# Altium footprint library RPIadaptor.PcbLib: 85 footprints (part 4 of 6)
Each footprint in its own frame and in the unit in brackets; x right, y up, seen from the top. Pads: shape width x height; smd on the part's side, far side on the other; paste and mask are expansions set on the pad; w line width, h text height; cw(c..) or ccw(c..) is an arc to the next point about the centre after c.
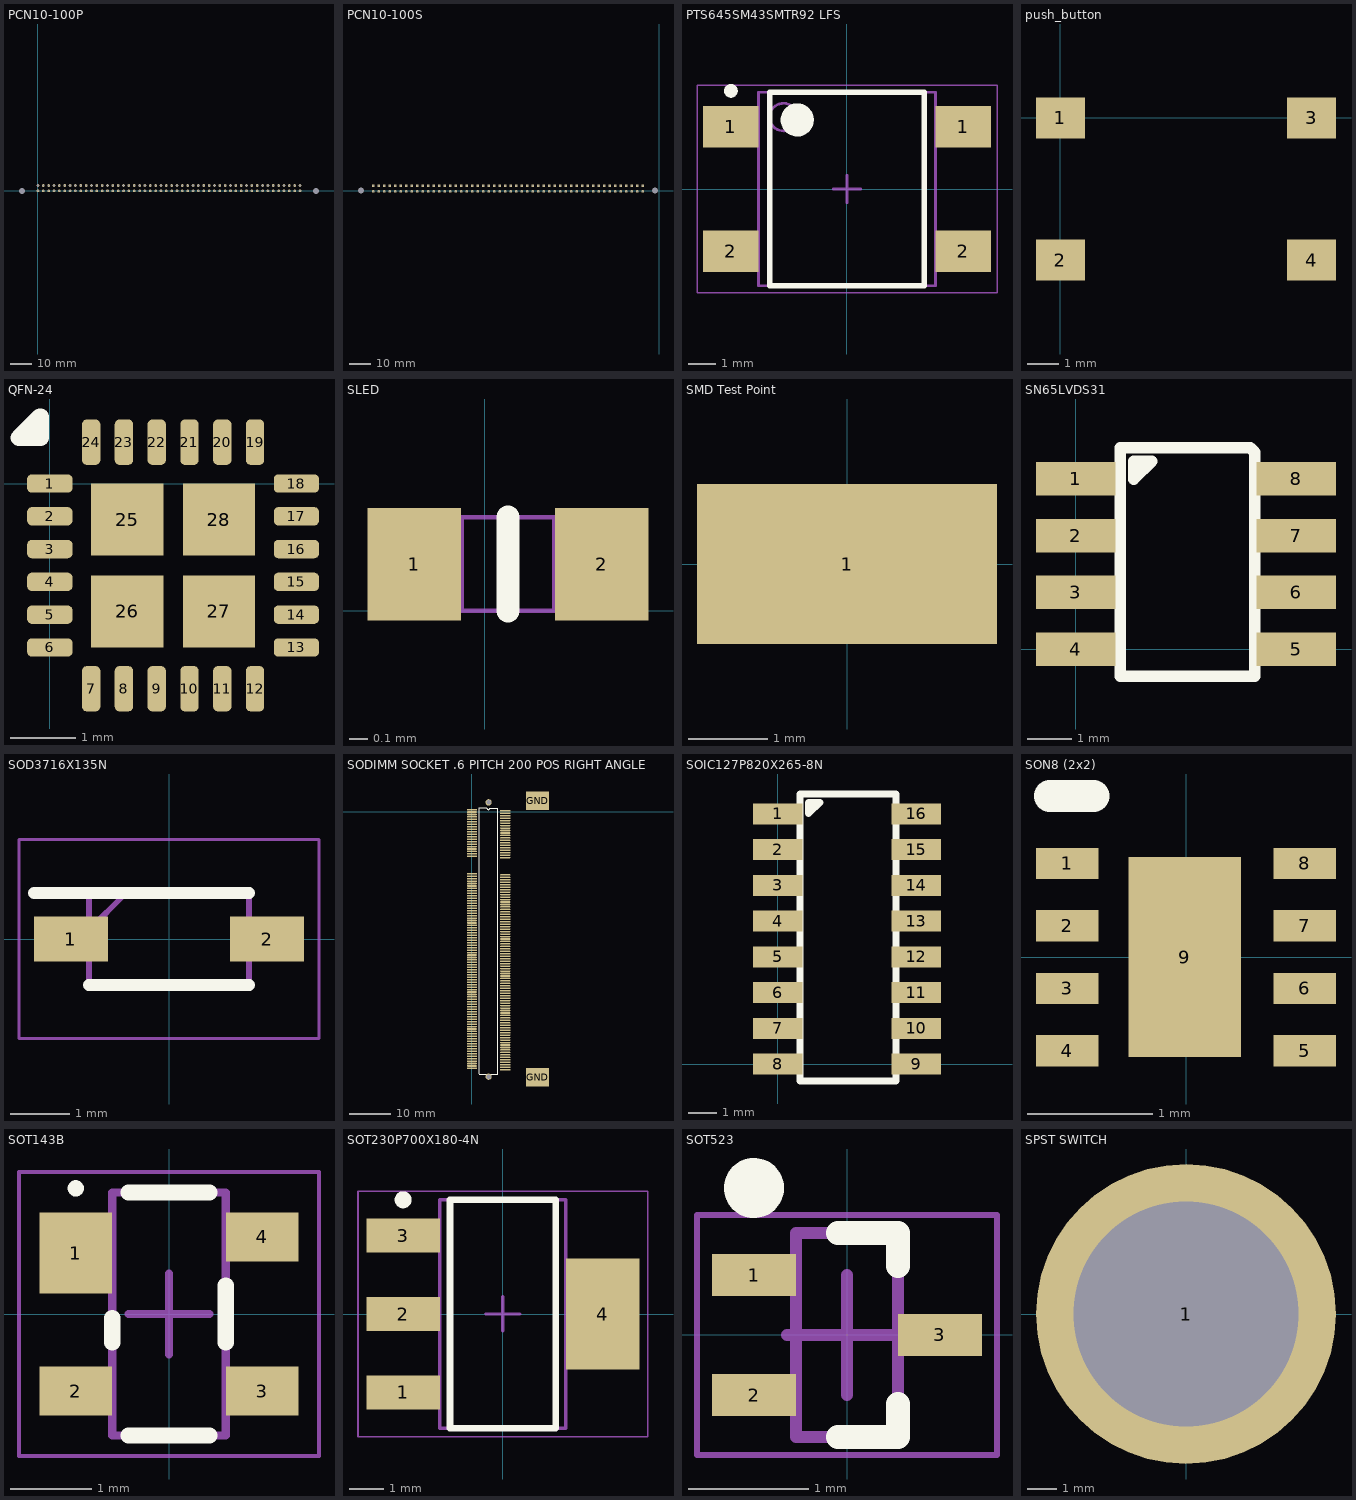
[diagram p3: the footprints below, top view; thin cyan lines are the x and y axes]

## PCN10-100P [mil]
pads (102):
  round 50 hole 31.5: 1(0,0) 2(0,100) 3(100,0) 4(100,100) 5(200,0) 6(200,100) 7(300,0) 8(300,100) 9(400,0) 10(400,100) 11(500,0) 12(500,100) 13(600,0) 14(600,100) 15(700,0) 16(700,100) 17(800,0) 18(800,100) 19(900,0) 20(900,100) 21(1000,0) 22(1000,100) 23(1100,0) 24(1100,100) 25(1200,0) 26(1200,100) 27(1300,0) 28(1300,100) 29(1400,0) 30(1400,100) 31(1500,0) 32(1500,100) 33(1600,0) 34(1600,100) 35(1700,0) 36(1700,100) 37(1800,0) 38(1800,100) 39(1900,0) 40(1900,100) 41(2000,0) 42(2000,100) 43(2100,0) 44(2100,100) 45(2200,0) 46(2200,100) 47(2300,0) 48(2300,100) 49(2400,0) 50(2400,100) 51(2500,0) 52(2500,100) 53(2600,0) 54(2600,100) 55(2700,0) 56(2700,100) 57(2800,0) 58(2800,100) 59(2900,0) 60(2900,100) 61(3000,0) 62(3000,100) 63(3100,0) 64(3100,100) 65(3200,0) 66(3200,100) 67(3300,0) 68(3300,100) 69(3400,0) 70(3400,100) 71(3500,0) 72(3500,100) 73(3600,0) 74(3600,100) 75(3700,0) 76(3700,100) 77(3800,0) 78(3800,100) 79(3900,0) 80(3900,100) 81(4000,0) 82(4000,100) 83(4100,0) 84(4100,100) 85(4200,0) 86(4200,100) 87(4300,0) 88(4300,100) 89(4400,0) 90(4400,100) 91(4500,0) 92(4500,100) 93(4600,0) 94(4600,100) 95(4700,0) 96(4700,100) 97(4800,0) 98(4800,100) 99(4900,0) 100(4900,100)
  round 60 hole 110: ""(-300,0) ""(5200,0)
3D body "PCN10-100P-2.54DSA.stp": height 456.69, standoff -125.98, extent -402,-119.29 5302.72,219.29

## PCN10-100S [mil]
pads (102):
  round 50 hole 31.5: 1(-5200,-13.62) 2(-5200,88.38) 3(-5100,-13.62) 4(-5100,88.38) 5(-5000,-13.62) 6(-5000,88.38) 7(-4900,-13.62) 8(-4900,88.38) 9(-4800,-13.62) 10(-4800,88.38) 11(-4700,-13.62) 12(-4700,88.38) 13(-4600,-13.62) 14(-4600,88.38) 15(-4500,-13.62) 16(-4500,88.38) 17(-4400,-13.62) 18(-4400,88.38) 19(-4300,-13.62) 20(-4300,88.38) 21(-4200,-13.62) 22(-4200,88.38) 23(-4100,-13.62) 24(-4100,88.38) 25(-4000,-13.62) 26(-4000,88.38) 27(-3900,-13.62) 28(-3900,88.38) 29(-3800,-13.62) 30(-3800,88.38) 31(-3700,-13.62) 32(-3700,88.38) 33(-3600,-13.62) 34(-3600,88.38) 35(-3500,-13.62) 36(-3500,88.38) 37(-3400,-13.62) 38(-3400,88.38) 39(-3300,-13.62) 40(-3300,88.38) 41(-3200,-13.62) 42(-3200,88.38) 43(-3100,-13.62) 44(-3100,88.38) 45(-3000,-13.62) 46(-3000,88.38) 47(-2900,-13.62) 48(-2900,88.38) 49(-2800,-13.62) 50(-2800,88.38) 51(-2700,-13.62) 52(-2700,88.38) 53(-2600,-13.62) 54(-2600,88.38) 55(-2500,-13.62) 56(-2500,88.38) 57(-2400,-13.62) 58(-2400,88.38) 59(-2300,-13.62) 60(-2300,88.38) 61(-2200,-13.62) 62(-2200,88.38) 63(-2100,-13.62) 64(-2100,88.38) 65(-2000,-13.62) 66(-2000,88.38) 67(-1900,-13.62) 68(-1900,88.38) 69(-1800,-13.62) 70(-1800,88.38) 71(-1700,-13.62) 72(-1700,88.38) 73(-1600,-13.62) 74(-1600,88.38) 75(-1500,-13.62) 76(-1500,88.38) 77(-1400,-13.62) 78(-1400,88.38) 79(-1300,-13.62) 80(-1300,88.38) 81(-1200,-13.62) 82(-1200,88.38) 83(-1100,-13.62) 84(-1100,88.38) 85(-1000,-13.62) 86(-1000,88.38) 87(-900,-13.62) 88(-900,88.38) 89(-800,-13.62) 90(-800,88.38) 91(-700,-13.62) 92(-700,88.38) 93(-600,-13.62) 94(-600,88.38) 95(-500,-13.62) 96(-500,88.38) 97(-400,-13.62) 98(-400,88.38) 99(-300,-13.62) 100(-300,88.38)
  round 60 hole 110: ""(-5421.65,0) ""(-78.35,0)
3D body "PCN10MC-100S-2.54DSA.stp": height 492.13, standoff -153.54, extent -5520.16,-123 20,195.9

## PTS645SM43SMTR92 LFS [mm]
height 4.3
pads (4):
  rect 2x1.5 smd: 1(-4.2,2.25) 1(4.2,2.25) 2(-4.2,-2.25) 2(4.2,-2.25)
Top Overlay:
  circle w0.6: c-1.8,2.5 r0.3
  circle w0.25: c-4.2,3.55 r0.125
  lines w0.2: -2.8,-3.5 2.8,-3.5 2.8,3.5 -2.8,3.5 -2.8,-3.5
Mechanical 13:
  circle w0.1: c-2.3,2.6 r0.5
  lines w0.1: -3.2,-3.5 3.2,-3.5 3.2,3.5 -3.2,3.5 -3.2,-3.5
Mechanical 15:
  lines w0.05: -5.425,-3.75 5.425,-3.75 5.425,3.75 -5.425,3.75 -5.425,-3.75
  lines w0.1: -0.5,0 0.5,0 ; 0,-0.5 0,0.5
3D body "PTS645SM43SMTR92 LFS.step": height 4.3, standoff 0, extent -4.743,-3.5 4.743,3.5

## push_button [mm]
pads (4):
  rect 1.55x1.3 smd: 1(0,0) 2(0,-4.5) 3(7.95,0) 4(7.95,-4.5)
3D body "430182043816 (rev1) (1).stp": height 4.3, standoff 0, extent -0.487,-5.31 8.513,0.89

## QFN-24 [mm]
pads (28):
  rrect50% 0.69x0.28 smd: 1(0,0) 2(0,-0.5) 3(0,-1) 4(0,-1.5) 5(0,-2) 6(0,-2.5) 13(3.76,-2.5) 14(3.76,-2) 15(3.76,-1.5) 16(3.76,-1) 17(3.76,-0.5) 18(3.76,0)
  rrect50% 0.28x0.69 smd: 7(0.63,-3.13) 8(1.13,-3.13) 9(1.63,-3.13) 10(2.13,-3.13) 11(2.63,-3.13) 12(3.13,-3.13) 19(3.13,0.63) 20(2.63,0.63) 21(2.13,0.63) 22(1.63,0.63) 23(1.13,0.63) 24(0.63,0.63)
  rect 1.1x1.1 smd: 25(1.18,-0.55) 26(1.18,-1.95) 27(2.58,-1.95) 28(2.58,-0.55)
Top Overlay:
  lines w0.254: -0.47,0.7 -0.14,0.7 -0.14,1.02 -0.15,1.02 -0.47,0.7
3D body "User Library-QFN 24 4x4.step": height 0.9, standoff 0, extent -0.12,-3.264 3.884,0.74

## SLED [mil]
pads (2):
  rect 20x24 smd: 1(-15,10) 2(25,10)
Top Overlay:
  lines w5: 5,0 5,20
Mechanical 1:
  lines w1: -15,0 -15,20 -8.94,20 24.68,20 24.68,0 -14.69,0 ; -4.84,0 -4.84,20 ; 14.84,0 14.84,20
3D body: height 18, standoff 0, extent -5,0 15,20
3D body: height 18, standoff 0, extent 15,0 24.68,20
3D body: height 18, standoff 0, extent -15,0 -5,20

## SMD Test Point [mm]
pads (1):
  rect 3.8x2.03 smd: 1(0,0)
3D body: height 1.5, standoff -1.5, extent -0.127,0.127 -0.127,0.127
3D body "User Library-User Library-Keystone_5019.STEP": height 2.29, standoff 0, extent -1.905,-1.015 1.905,1.015

## SN65LVDS31 [mm]
pads (8):
  rect 1.77x0.75 smd: 1(0,3.81) 2(0,2.54) 3(0,1.27) 4(0,0) 5(4.928,0) 6(4.928,1.27) 7(4.928,2.54) 8(4.928,3.81)
Top Overlay:
  lines w0.254: 1,-0.6 4,-0.6 4,4.4 3.9,4.5 1,4.5 1,-0.6 ; 1.3,3.8 1.3,4.2 1.7,4.2 1.3,3.8
3D body "D8.stp": height 1.76, standoff 0, extent -0.599,-0.602 5.599,4.402

## SOD3716X135N [mm]
pads (2):
  rect 1.25x0.75 smd: 1(-1.65,0) 2(1.65,0)
Top Overlay:
  lines w0.2: -2.275,0.775 1.35,0.775 ; -1.35,-0.775 1.35,-0.775
Mechanical 13:
  lines w0.1: -1.35,0.15 -0.725,0.775 ; -1.35,-0.775 -1.35,0.775 1.35,0.775 1.35,-0.775 -1.35,-0.775
Mechanical 15:
  lines w0.05: -2.525,-1.675 -2.525,1.675 2.525,1.675 2.525,-1.675 -2.525,-1.675
3D body "1n4148w.stp": height 1.35, standoff 0, extent -1.85,-0.775 1.85,0.775

## SODIMM SOCKET .6 PITCH 200 POS RIGHT ANGLE [mm]
pads (204):
  rect 2.5x0.38 smd: 1(0,0.5)
  oval 2.5x0.38 smd: 2(8.1,0.2) 3(0,-0.1) 4(8.1,-0.4) 5(0,-0.7) 6(8.1,-1) 7(0,-1.3) 8(8.1,-1.6) 9(0,-1.9) 10(8.1,-2.2) 11(0,-2.5) 12(8.1,-2.8) 13(0,-3.1) 14(8.1,-3.4) 15(0,-3.7) 16(8.1,-4) 17(0,-4.3) 18(8.1,-4.6) 19(0,-4.9) 20(8.1,-5.2) 21(0,-5.5) 22(8.1,-5.8) 23(0,-6.1) 24(8.1,-6.4) 25(0,-6.7) 26(8.1,-7) 27(0,-7.3) 28(8.1,-7.6) 29(0,-7.9) 30(8.1,-8.2) 31(0,-8.5) 32(8.1,-8.8) 33(0,-9.1) 34(8.1,-9.4) 35(0,-9.7) 36(8.1,-10) 37(0,-10.3) 38(8.1,-10.6) 39(0,-10.9) 40(8.1,-11.2) 41(0,-15.1) 42(8.1,-15.4) 43(0,-15.7) 44(8.1,-16) 45(0,-16.3) 46(8.1,-16.6) 47(0,-16.9) 48(8.1,-17.2) 49(0,-17.5) 50(8.1,-17.8) 51(0,-18.1) 52(8.1,-18.4) 53(0,-18.7) 54(8.1,-19) 55(0,-19.3) 56(8.1,-19.6) 57(0,-19.9) 58(8.1,-20.2) 59(0,-20.5) 60(8.1,-20.8) 61(0,-21.1) 62(8.1,-21.4) 63(0,-21.7) 64(8.1,-22) 65(0,-22.3) 66(8.1,-22.6) 67(0,-22.9) 68(8.1,-23.2) 69(0,-23.5) 70(8.1,-23.8) 71(0,-24.1) 72(8.1,-24.4) 73(0,-24.7) 74(8.1,-25) 75(0,-25.3) 76(8.1,-25.6) 77(0,-25.9) 78(8.1,-26.2) 79(0,-26.5) 80(8.1,-26.8) 81(0,-27.1) 82(8.1,-27.4) 83(0,-27.7) 84(8.1,-28) 85(0,-28.3) 86(8.1,-28.6) 87(0,-28.9) 88(8.1,-29.2) 89(0,-29.5) 90(8.1,-29.8) 91(0,-30.1) 92(8.1,-30.4) 93(0,-30.7) 94(8.1,-31) 95(0,-31.3) 96(8.1,-31.6) 97(0,-31.9) 98(8.1,-32.2) 99(0,-32.5) 100(8.1,-32.8) 101(0,-33.1) 102(8.1,-33.4) 103(0,-33.7) 104(8.1,-34) 105(0,-34.3) 106(8.1,-34.6) 107(0,-34.9) 108(8.1,-35.2) 109(0,-35.5) 110(8.1,-35.8) 111(0,-36.1) 112(8.1,-36.4) 113(0,-36.7) 114(8.1,-37) 115(0,-37.3) 116(8.1,-37.6) 117(0,-37.9) 118(8.1,-38.2) 119(0,-38.5) 120(8.1,-38.8) 121(0,-39.1) 122(8.1,-39.4) 123(0,-39.7) 124(8.1,-40) 125(0,-40.3) 126(8.1,-40.6) 127(0,-40.9) 128(8.1,-41.2) 129(0,-41.5) 130(8.1,-41.8) 131(0,-42.1) 132(8.1,-42.4) 133(0,-42.7) 134(8.1,-43) 135(0,-43.3) 136(8.1,-43.6) 137(0,-43.9) 138(8.1,-44.2) 139(0,-44.5) 140(8.1,-44.8) 141(0,-45.1) 142(8.1,-45.4) 143(0,-45.7) 144(8.1,-46) 145(0,-46.3) 146(8.1,-46.6) 147(0,-46.9) 148(8.1,-47.2) 149(0,-47.5) 150(8.1,-47.8) 151(0,-48.1) 152(8.1,-48.4) 153(0,-48.7) 154(8.1,-49) 155(0,-49.3) 156(8.1,-49.6) 157(0,-49.9) 158(8.1,-50.2) 159(0,-50.5) 160(8.1,-50.8) 161(0,-51.1) 162(8.1,-51.4) 163(0,-51.7) 164(8.1,-52) 165(0,-52.3) 166(8.1,-52.6) 167(0,-52.9) 168(8.1,-53.2) 169(0,-53.5) 170(8.1,-53.8) 171(0,-54.1) 172(8.1,-54.4) 173(0,-54.7) 174(8.1,-55) 175(0,-55.3) 176(8.1,-55.6) 177(0,-55.9) 178(8.1,-56.2) 179(0,-56.5) 180(8.1,-56.8) 181(0,-57.1) 182(8.1,-57.4) 183(0,-57.7) 184(8.1,-58) 185(0,-58.3) 186(8.1,-58.6) 187(0,-58.9) 188(8.1,-59.2) 189(0,-59.5) 190(8.1,-59.8) 191(0,-60.1) 192(8.1,-60.4) 193(0,-60.7) 194(8.1,-61) 195(0,-61.3) 196(8.1,-61.6) 197(0,-61.9) 198(8.1,-62.2) 199(0,-62.5) 200(8.1,-62.8)
  rect 5.6x4.5 smd: GND(16,-64.7) GND(16,2.7)
  round 1.524 hole 1.1 unplated: SODIMM_MH1(4.05,2.25) SODIMM_MH2(4.05,-64.5)
Top Overlay:
  lines w0.2: 1.75,-63.9 6.25,-63.9 ; 1.75,-63.8 1.75,0.9 ; 3.65,0.85 ccw(c4,0.85) 4.35,0.85 ; 6.25,-63.8 6.25,0.85
  lines w0.254: 1.75,0.9 3.6,0.9 ; 4.35,0.85 6.2,0.85
3D body "c-1473005-4-j1-3d.stp": height 5.2, standoff -0.7, extent -0.9,-66.9 25.15,4.6

## SOIC127P820X265-8N [mm] "SOIC, 8-Leads, Body 6.40x5.71mm, Pitch 1.27mm, IPC Medium Density"
height 2.65
pads (16):
  rect 1.77x0.75 smd: 1(0,8.89) 2(0,7.62) 3(0,6.35) 4(0,5.08) 5(0,3.81) 6(0,2.54) 7(0,1.27) 8(0,0) 9(4.928,0) 10(4.928,1.27) 11(4.928,2.54) 12(4.928,3.81) 13(4.928,5.08) 14(4.928,6.35) 15(4.928,7.62) 16(4.928,8.89)
Top Overlay:
  lines w0.254: 0.8,-0.6 0.8,9.6 4.2,9.6 4.2,-0.6 0.8,-0.6 ; 1.1,8.9 1.5,9.3 1.1,9.3 1.1,8.9
3D body "D16.stp": height 1.76, standoff 0, extent -0.599,-0.504 5.599,9.504

## SON8 (2x2) [mm]
pads (9):
  rect 0.5x0.25 smd: 1(-0.95,0.75) 2(-0.95,0.25) 3(-0.95,-0.25) 4(-0.95,-0.75) 5(0.95,-0.75) 6(0.95,-0.25) 7(0.95,0.25) 8(0.95,0.75)
  rect 0.9x1.6 smd: 9(-0.01,0)
Top Overlay:
  lines w0.254: -1.09,1.29 -0.74,1.29
3D body "User Library-SON8-2x2mm-1.step": height 0.77, standoff -0.03, extent -1,-1.01 1,0.99

## SOT143B [mm] "SOT143, 4-Leads, Body 2.90x2.30mm, Pitch 1.90mm, IPC Medium Density"
height 1.1
pads (4):
  rect 0.9x1 smd: 1(-1.15,0.75)
  rect 0.9x0.6 smd: 2(-1.15,-0.95) 3(1.15,-0.95) 4(1.15,0.95)
Top Overlay:
  circle w0.1: c-1.15,1.55 r0.05
  lines w0.2: -0.7,-0.35 -0.7,-0.05 ; -0.5,-1.5 0.5,-1.5 ; -0.5,1.5 0.5,1.5 ; 0.7,-0.35 0.7,0.35
Mechanical 13:
  lines w0.1: -0.7,-1.5 0.7,-1.5 0.7,1.5 -0.7,1.5 -0.7,-1.5
Mechanical 15:
  lines w0.05: -1.85,-1.75 1.85,-1.75 1.85,1.75 -1.85,1.75 -1.85,-1.75
  lines w0.1: -0.5,0 0.5,0 ; 0,-0.5 0,0.5
3D body "SOT143B.step": height 1.1, standoff 0, extent -1.15,-1.5 1.15,1.5

## SOT230P700X180-4N [mm] "SOT223, 4-Leads, Body 6.50x7.00mm (avg), Pitch 2.30mm, IPC Medium Density"
height 1.8
pads (4):
  rect 2.15x1 smd: 1(-2.925,-2.3) 2(-2.925,0) 3(-2.925,2.3)
  rect 2.15x3.25 smd: 4(2.925,0)
Top Overlay:
  circle w0.25: c-2.925,3.35 r0.125
  lines w0.2: -1.55,-3.35 -1.55,3.35 1.55,3.35 1.55,-3.35 -1.55,-3.35
Mechanical 13:
  lines w0.1: -1.85,-3.35 -1.85,3.35 1.85,3.35 1.85,-3.35 -1.85,-3.35
Mechanical 15:
  lines w0.05: -4.25,-3.6 -4.25,3.6 4.25,3.6 4.25,-3.6 -4.25,-3.6
  lines w0.1: -0.5,0 0.5,0 ; 0,-0.5 0,0.5
3D body "SOT230P700X180-4N.step": height 1.8, standoff 0, extent -3.5,-3.35 3.5,3.35

## SOT523 [mm]
height 0.9
pads (3):
  rect 0.7x0.35 smd: 1(-0.775,0.5) 2(-0.775,-0.5) 3(0.775,0)
Top Overlay:
  circle w0.25: c-0.775,1.225 r0.125
  lines w0.2: -0.075,-0.85 0.425,-0.85 0.425,-0.575 ; -0.075,0.85 0.425,0.85 0.425,0.575
Mechanical 13:
  lines w0.1: -0.425,-0.85 -0.425,0.85 0.425,0.85 0.425,-0.85 -0.425,-0.85
Mechanical 15:
  lines w0.05: -1.25,-1 -1.25,1 1.25,1 1.25,-1 -1.25,-1
  lines w0.1: -0.5,0 0.5,0 ; 0,-0.5 0,0.5
3D body "SOT523.step": height 0.9, standoff 0, extent -0.8,-0.848 0.8,0.848

## SPST SWITCH [mm]
pads (1):
  round 10.16 hole 7.62: 1(0,0)
3D body "M2011SS1W01.stp": height 20.02, standoff -13.54, extent -5.994,-6.502 5.994,6.502